# Altium footprint library u025Library.PcbLib: 132 footprints (part 2 of 9)
Each footprint in its own frame and in the unit in brackets; x right, y up, seen from the top. Pads: shape width x height; smd on the part's side, far side on the other; paste and mask are expansions set on the pad; w line width, h text height; cw(c..) or ccw(c..) is an arc to the next point about the centre after c.
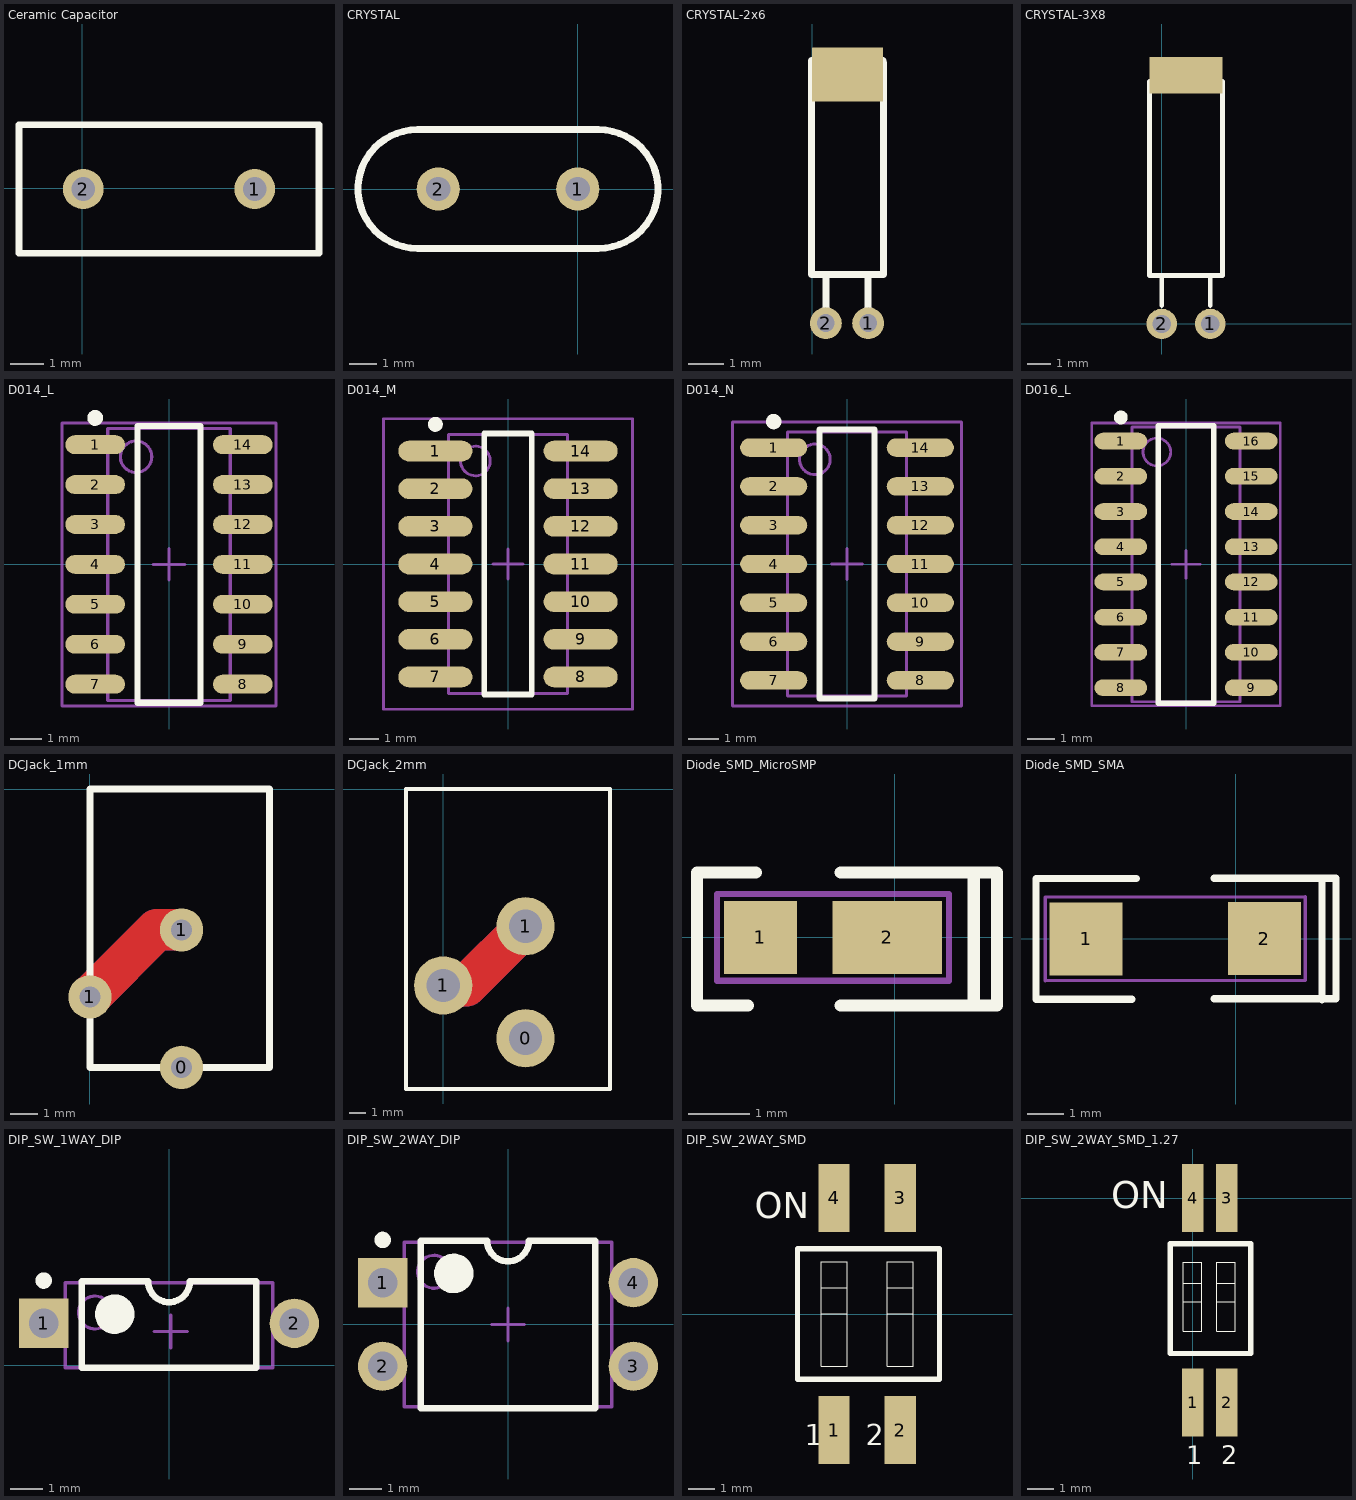
[diagram p1: the footprints below, top view; thin cyan lines are the x and y axes]

## Ceramic Capacitor [mm] "Ceramic Capacitor"
height 4
pads (2):
  round 1.2 hole 0.7: 1(5.11,-0.028) 2(0.03,-0.028)
Top Overlay:
  lines w0.2: -1.875,-1.933 -1.875,1.877 7.015,1.877 7.015,-1.933 -1.875,-1.933
3D body: height 7.5, standoff -1, extent -0.875,-0.823 6.116,0.874

## CRYSTAL [mil]
pads (2):
  round 62 hole 35: 1(0,0) 2(-200,0)
Top Overlay:
  lines w10: -230,-85 cw(c-230,0) -230,85 30,85 cw(c30,0) 30,-85 -230,-85
3D body: height 141.73, standoff -118.11, extent -316,-92.41 116.28,84.41

## CRYSTAL-2x6 [mm] "CRYSTAL - 2mm x 6mm"
pads (3):
  round 0.9 hole 0.5: 1(1.575,2.743) 2(0.381,2.743)
  rect 2x1.524 smd: ""(0.989,9.775)
Top Overlay:
  lines w0.203: -0.025,4.115 1.975,4.115 ; -0.025,4.166 -0.025,10.166 ; 0,10.16 2,10.16 ; 0.381,2.743 0.381,4.013 ; 1.575,2.743 1.575,4.013 ; 2.007,4.115 2.007,10.115

## CRYSTAL-3X8 [mil] "CRYSTAL-3X8"
pads (3):
  round 50 hole 30: 1(80,0) 2(0,0)
  rect 120x60 smd: ""(40,410)
Top Overlay:
  lines w8: 0,30 0,80 ; 80,30 80,80 ; -20,80 -20,400 100,400 100,80 -20,80
3D body: height 120.08, standoff -1.97, extent -24.52,-11.74 97.53,427.23

## D014_L [mm] "SOIC, 14-Leads, Body 8.7x3.9mm, Pitch 1.27mm, IPC High Density"
height 1.75
pads (14):
  oval 1.9x0.6 smd: 1(-2.35,3.81) 2(-2.35,2.54) 3(-2.35,1.27) 4(-2.35,0) 5(-2.35,-1.27) 6(-2.35,-2.54) 7(-2.35,-3.81) 8(2.35,-3.81) 9(2.35,-2.54) 10(2.35,-1.27) 11(2.35,0) 12(2.35,1.27) 13(2.35,2.54) 14(2.35,3.81)
Top Overlay:
  circle w0.25: c-2.35,4.66 r0.125
  lines w0.2: -1,-4.4 1,-4.4 1,4.4 -1,4.4 -1,-4.4
Mechanical 13:
  circle w0.1: c-1.05,3.425 r0.5
  lines w0.1: -1.95,-4.325 1.95,-4.325 1.95,4.325 -1.95,4.325 -1.95,-4.325
Mechanical 15:
  lines w0.1: -0.5,0 0.5,0 ; 0,-0.5 0,0.5 ; -3.4,-4.5 3.4,-4.5 3.4,4.5 -3.4,4.5 -3.4,-4.5
3D body: height 1.7, standoff 0, extent -2.984,-4.398 3.016,4.402

## D014_M [mm] "SOIC, 14-Leads, Body 8.7x3.9mm, Pitch 1.27mm, IPC Low Density"
height 1.75
pads (14):
  oval 2.5x0.7 smd: 1(-2.45,3.81) 2(-2.45,2.54) 3(-2.45,1.27) 4(-2.45,0) 5(-2.45,-1.27) 6(-2.45,-2.54) 7(-2.45,-3.81) 8(2.45,-3.81) 9(2.45,-2.54) 10(2.45,-1.27) 11(2.45,0) 12(2.45,1.27) 13(2.45,2.54) 14(2.45,3.81)
Top Overlay:
  circle w0.25: c-2.45,4.71 r0.125
  lines w0.2: -0.8,-4.4 0.8,-4.4 0.8,4.4 -0.8,4.4 -0.8,-4.4
Mechanical 13:
  circle w0.1: c-1.1,3.475 r0.5
  lines w0.1: -2,-4.375 2,-4.375 2,4.375 -2,4.375 -2,-4.375
Mechanical 15:
  lines w0.1: -0.5,0 0.5,0 ; 0,-0.5 0,0.5 ; -4.2,-4.9 4.2,-4.9 4.2,4.9 -4.2,4.9 -4.2,-4.9
3D body: height 1.7, standoff 0, extent -3.006,-4.401 2.994,4.399

## D014_N [mm] "SOIC, 14-Leads, Body 8.7x3.9mm, Pitch 1.27mm, IPC Medium Density"
height 1.75
pads (14):
  oval 2.2x0.6 smd: 1(-2.4,3.81) 2(-2.4,2.54) 3(-2.4,1.27) 4(-2.4,0) 5(-2.4,-1.27) 6(-2.4,-2.54) 7(-2.4,-3.81) 8(2.4,-3.81) 9(2.4,-2.54) 10(2.4,-1.27) 11(2.4,0) 12(2.4,1.27) 13(2.4,2.54) 14(2.4,3.81)
Top Overlay:
  circle w0.25: c-2.4,4.66 r0.125
  lines w0.2: -0.9,-4.4 0.9,-4.4 0.9,4.4 -0.9,4.4 -0.9,-4.4
Mechanical 13:
  circle w0.1: c-1.05,3.425 r0.5
  lines w0.1: -1.95,-4.325 1.95,-4.325 1.95,4.325 -1.95,4.325 -1.95,-4.325
Mechanical 15:
  lines w0.1: -0.5,0 0.5,0 ; 0,-0.5 0,0.5 ; -3.75,-4.65 3.75,-4.65 3.75,4.65 -3.75,4.65 -3.75,-4.65
3D body: height 1.7, standoff 0, extent -2.939,-4.399 3.061,4.401

## D016_L [mm] "SOIC, 16-Leads, Body 9.9x3.9mm, Pitch 1.27mm, IPC High Density"
height 1.75
pads (16):
  oval 1.9x0.6 smd: 1(-2.35,4.445) 2(-2.35,3.175) 3(-2.35,1.905) 4(-2.35,0.635) 5(-2.35,-0.635) 6(-2.35,-1.905) 7(-2.35,-3.175) 8(-2.35,-4.445) 9(2.35,-4.445) 10(2.35,-3.175) 11(2.35,-1.905) 12(2.35,-0.635) 13(2.35,0.635) 14(2.35,1.905) 15(2.35,3.175) 16(2.35,4.445)
Top Overlay:
  circle w0.25: c-2.35,5.295 r0.125
  lines w0.2: -1,-5 1,-5 1,5 -1,5 -1,-5
Mechanical 13:
  circle w0.1: c-1.05,4.05 r0.5
  lines w0.1: -1.95,-4.95 1.95,-4.95 1.95,4.95 -1.95,4.95 -1.95,-4.95
Mechanical 15:
  lines w0.1: -0.5,0 0.5,0 ; 0,-0.5 0,0.5 ; -3.4,-5.1 3.4,-5.1 3.4,5.1 -3.4,5.1 -3.4,-5.1
3D body: height 1.4, standoff 0, extent -2.969,-4.93 3.031,4.97

## DCJack_1mm [mil] "DCJack_1mm"
pads (3):
  round 61.42 hole 30: 0(130,-395) 1(0,-295) 1(130,-200)
Top Layer:
  lines w59.06: 0,-295 95,-200 130,-200
Bottom Layer:
  lines w59.06: 0,-295 95,-200 130,-200
Top Overlay:
  lines w10: 0,-395 255,-395 ; 0,-393.7 0,0 255,0 255,-393.7

## DCJack_2mm [mm] "DCJack_2mm"
pads (3):
  round 3.5 hole 2: 0(4.953,-14.986) 1(0,-11.811) 1(4.953,-8.255)
Top Layer:
  lines w2.5: 0,-11.811 1.397,-11.811 4.953,-8.255
Bottom Layer:
  lines w0.254: 3.556,-8.255 4.953,-8.255
  lines w2.5: 0,-11.811 1.397,-11.811 4.953,-8.255
Top Overlay:
  lines w0.254: 10,0 -2.235,0 -2.235,-18.034 10.033,-18.034 10.033,0
3D body: height 10.5, standoff -4, extent -0.11,-15.676 9.246,-0.376

## Diode_SMD_MicroSMP [mm] "Diode_SMD_MicroSMP"
height 0.6
pads (2):
  rect 1.2x1.2 smd: 1(-2.21,0)
  rect 1.8x1.2 smd: 2(-0.127,0)
Top Overlay:
  lines w0.2: -2.413,-1.118 -3.251,-1.118 -3.251,1.067 -2.286,1.067 ; -0.889,-1.118 1.676,-1.118 1.676,1.067 -0.889,1.067 ; 1.295,-1.067 1.295,1.041
Mechanical 15:
  lines w0.1: -2.921,-0.711 -2.921,0.711 0.889,0.711 0.889,-0.711 -2.921,-0.711
3D body: height 0.73, standoff 0, extent -2.036,-0.776 0.664,0.624

## Diode_SMD_SMA [mm] "Diode_SMD_SMA"
height 2.3
pads (2):
  rect 2x2 smd: 1(-4.09,0) 2(0.788,0.011)
Top Overlay:
  lines w0.2: -2.845,-1.651 -5.461,-1.651 -5.461,1.651 -2.718,1.651 ; -0.583,-1.64 2.744,-1.64 2.744,1.662 -0.583,1.662 ; 2.363,-1.666 2.363,1.636
Mechanical 15:
  lines w0.1: -5.207,-1.144 1.906,-1.132 1.906,1.154 -5.207,1.142 ; -5.207,-1.143 -5.207,1.143
3D body: height 2.5, standoff 0.1, extent -4.276,-1.275 0.924,1.325

## DIP_SW_1WAY_DIP [mm] "DIP; 2 Leads; Row Spacing 7.62 mm; Pitch 2.54 mm"
height 5.6
pads (2):
  rect 1.5x1.5 hole 0.9: 1(-3.81,1.27)
  round 1.5 hole 0.9: 2(3.81,1.27)
Top Overlay:
  circle w0.25: c-3.81,2.57 r0.125
  circle w0.6: c-1.65,1.55 r0.3
  lines w0.2: -2.65,-0.076 -2.65,2.55 -0.635,2.55 ccw(c0,2.55) 0.635,2.55 2.65,2.55 2.65,-0.076 -2.65,-0.076
Mechanical 13:
  circle w0.1: c-2.25,1.6 r0.5
  lines w0.1: -3.15,-0.076 -3.15,2.5 3.15,2.5 3.15,-0.076 -3.15,-0.076
Mechanical 15:
  lines w0.1: -0.449,1.024 0.551,1.024 ; 0.051,0.524 0.051,1.524
3D body: height 3.1, standoff -4, extent -5.303,-0.445 5.202,3.035

## DIP_SW_2WAY_DIP [mm] "DIP; 4 Leads; Row Spacing 7.62 mm; Pitch 2.54 mm"
height 5.6
pads (4):
  rect 1.5x1.5 hole 0.9: 1(-3.81,1.27)
  round 1.5 hole 0.9: 2(-3.81,-1.27) 3(3.81,-1.27) 4(3.81,1.27)
Top Overlay:
  circle w0.25: c-3.81,2.57 r0.125
  circle w0.6: c-1.65,1.55 r0.3
  lines w0.2: -2.65,-2.55 -2.65,2.55 -0.635,2.55 ccw(c0,2.55) 0.635,2.55 2.65,2.55 2.65,-2.55 -2.65,-2.55
Mechanical 13:
  circle w0.1: c-2.25,1.6 r0.5
  lines w0.1: -3.15,-2.5 -3.15,2.5 3.15,2.5 3.15,-2.5 -3.15,-2.5
Mechanical 15:
  lines w0.1: -0.5,0 0.5,0 ; 0,-0.5 0,0.5
3D body: height 3.3, standoff -0.9, extent -3.759,-2.438 3.861,2.642

## DIP_SW_2WAY_SMD [mm] "DIP Switch; 4 Leads"
height 5.06
pads (4):
  rect 1.2x2.6 smd: 1(-8.89,-4.45) 2(-6.35,-4.45) 3(-6.35,4.45) 4(-8.89,4.45)
Top Overlay:
  lines w0.025: -9.39,0 -8.39,0 ; -9.39,1 -8.39,1 ; -6.85,0 -5.85,0 ; -6.85,1 -5.85,1 ; -9.39,-2 -9.39,2 -8.39,2 -8.39,-2 -9.39,-2 ; -6.85,-2 -6.85,2 -5.85,2 -5.85,-2 -6.85,-2
  lines w0.2: -10.29,-2.5 -10.29,2.5 -4.851,2.5 -4.851,-2.5 -10.29,-2.5
  text "2" at -7.681,-5.032 h0.8
  text "1" at -10.006,-5.032 h0.8
  text "ON" at -11.938,3.678 h1
3D body: height 6.05, standoff 0, extent -11.019,-4.953 -4.119,5.327

## DIP_SW_2WAY_SMD_1.27 [mm] "DIP Switch; 4 Leads"
height 5.06
pads (4):
  rect 0.8x2.54 smd: 1(0,-7.62) 2(1.27,-7.62) 3(1.27,0) 4(0,0)
Top Overlay:
  lines w0.025: -0.348,-3.861 0.33,-3.861 ; -0.348,-3.166 0.33,-3.166 ; 0.897,-3.861 1.575,-3.861 ; 0.897,-3.166 1.575,-3.166 ; -0.348,-4.953 -0.348,-2.388 0.33,-2.388 0.33,-4.953 -0.348,-4.953 ; 0.897,-4.953 0.897,-2.388 1.575,-2.388 1.575,-4.953 0.897,-4.953
  lines w0.2: -0.838,-5.791 2.159,-5.791 2.159,-1.702 -0.838,-1.702 -0.838,-5.791
  text "2" at 1.067,-9.906 h0.7
  text "ON" at -3.048,-0.381 h1
  text "1" at -0.254,-9.906 h0.7
3D body: height 1.5, standoff -0.05, extent -1.281,-7.033 2.489,-0.333